# Altium footprint library IC.PcbLib: 386 footprints (part 21 of 30)
Each footprint in its own frame and in the unit in brackets; x right, y up, seen from the top. Pads: shape width x height; smd on the part's side, far side on the other; paste and mask are expansions set on the pad; w line width, h text height; cw(c..) or ccw(c..) is an arc to the next point about the centre after c.
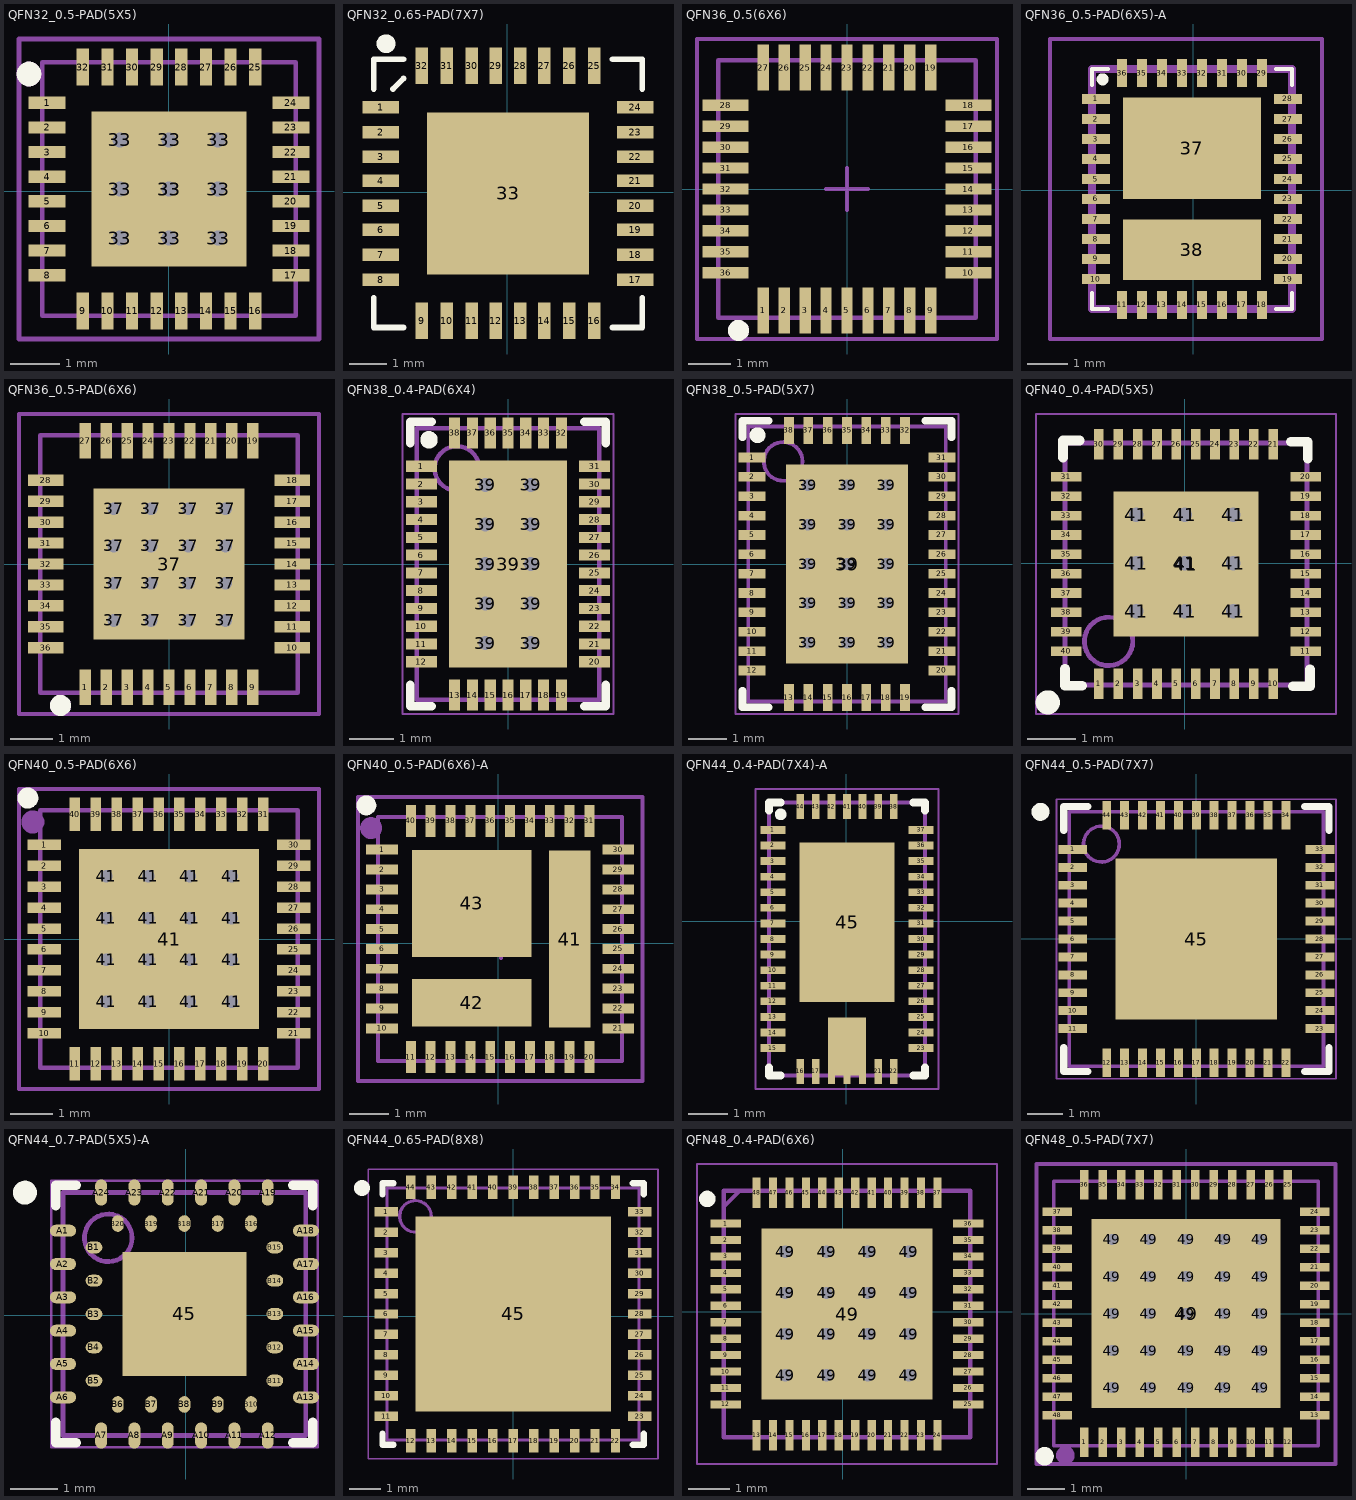
[diagram p20: the footprints below, top view; thin cyan lines are the x and y axes]

## QFN32_0.5-PAD(5X5) [mm] "QFN, 32-Leads, Body 5.2x5.2mm (max), Pitch 0.50mm, IPC Medium Density"
height 1
pads (42):
  rect 0.75x0.25 smd: 1(-2.475,1.801) 2(-2.475,1.301) 3(-2.475,0.801) 4(-2.475,0.301) 5(-2.475,-0.199) 6(-2.475,-0.699) 7(-2.475,-1.199) 8(-2.475,-1.699) 17(2.475,-1.699) 18(2.475,-1.199) 19(2.475,-0.699) 20(2.475,-0.199) 21(2.475,0.301) 22(2.475,0.801) 23(2.475,1.301) 24(2.475,1.801)
  rect 0.25x0.75 smd: 9(-1.75,-2.424) 10(-1.25,-2.424) 11(-0.75,-2.424) 12(-0.25,-2.424) 13(0.25,-2.424) 14(0.75,-2.424) 15(1.25,-2.424) 16(1.75,-2.424) 25(1.75,2.526) 26(1.25,2.526) 27(0.75,2.526) 28(0.25,2.526) 29(-0.25,2.526) 30(-0.75,2.526) 31(-1.25,2.526) 32(-1.75,2.526)
  round 0.61 hole 0.305: 33(-1,-0.949) 33(-1,0.051) 33(-1,1.051) 33(0,-0.949) 33(0,0.051) 33(0,1.051) 33(1,-0.949) 33(1,0.051) 33(1,1.051)
  rect 3.15x3.15 smd paste-3: 33(0,0.051)
Top Overlay:
  circle w0.25: c-2.845,2.388 r0.125
Top Paste:
  rectangle: 0.15,0.201 1.45,1.501
  region: -0.15,0.201 -0.15,1.501 -1.45,1.501 -1.45,0.201
  region: -0.15,-0.099 -1.45,-0.099 -1.45,-1.399 -0.15,-1.399
  region: 0.15,-0.099 0.15,-1.399 1.45,-1.399 1.45,-0.099
Mechanical 15:
  circle w0.25: c-2.845,2.388 r0.125
  lines w0.1: -0.5,0.051 0.5,0.051 ; 0,-0.449 0,0.551 ; -3.048,-2.997 3.048,-2.997 3.048,3.099 -3.048,3.099 -3.048,-2.997 ; -2.575,-2.524 2.575,-2.524 2.575,2.626 -2.575,2.626 -2.575,-2.524
3D body "QFN32-6X6.STEP": height 0.92, standoff -0.01, extent -2.5,-2.449 2.501,2.551

## QFN32_0.65-PAD(7X7) [mil]
height 39.37
pads (33):
  rect 38x13 smd: 1(-132,89) 2(-132,63) 3(-132,37) 4(-132,12) 5(-132,-14) 6(-132,-39) 7(-132,-65) 8(-132,-91) 17(134,-91) 18(134,-65) 19(134,-39) 20(134,-14) 21(134,12) 22(134,37) 23(134,63) 24(134,89)
  rect 13x38 smd: 9(-89,-134) 10(-63,-134) 11(-37,-134) 12(-12,-134) 13(14,-134) 14(39,-134) 15(65,-134) 16(91,-134) 25(91,132) 26(65,132) 27(39,132) 28(14,132) 29(-12,132) 30(-37,132) 31(-63,132) 32(-89,132)
  rect 169x169 smd: 33(1,-1)
Top Overlay:
  circle w9.84: c-126.4,155.2 r4.92
  lines w6: -139,-110 -139,-141 -108,-141 ; -139,108 -139,139 -108,139 ; -119,108 -108,119 ; 110,-141 141,-141 141,-110 ; 110,139 141,139 141,108
3D body "User Library-QFN-32.STEP": height 40.26, standoff -3.69, extent -136.59,-138.8 139,136.8

## QFN36_0.5(6X6) [mm]
pads (36):
  rect 0.27x1.1 smd mask+0.08: 1(-2,-2.9) 2(-1.5,-2.9) 3(-1,-2.9) 4(-0.5,-2.9) 5(0,-2.9) 6(0.5,-2.9) 7(1,-2.9) 8(1.5,-2.9) 9(2,-2.9) 19(2,2.9) 20(1.5,2.9) 21(1,2.9) 22(0.5,2.9) 23(0,2.9) 24(-0.5,2.9) 25(-1,2.9) 26(-1.5,2.9) 27(-2,2.9)
  rect 1.1x0.27 smd mask+0.08: 10(2.9,-2) 11(2.9,-1.5) 12(2.9,-1) 13(2.9,-0.5) 14(2.9,0) 15(2.9,0.5) 16(2.9,1) 17(2.9,1.5) 18(2.9,2) 28(-2.9,2) 29(-2.9,1.5) 30(-2.9,1) 31(-2.9,0.5) 32(-2.9,0) 33(-2.9,-0.5) 34(-2.9,-1) 35(-2.9,-1.5) 36(-2.9,-2)
Top Overlay:
  circle w0.25: c-2.591,-3.378 r0.125
Mechanical 15:
  circle w0.25: c-2.591,-3.378 r0.125
  lines w0.1: -0.5,0 0.5,0 ; 0,-0.5 0,0.5 ; -3.581,-3.581 3.581,-3.581 3.581,3.581 -3.581,3.581 -3.581,-3.581 ; -3.075,-3.075 3.075,-3.075 3.075,3.075 -3.075,3.075 -3.075,-3.075
3D body "QFN36-6X6.STEP": height 0.8, standoff 0, extent -3.06,-3.06 3.06,3.06

## QFN36_0.5-PAD(6X5)-A [mm]
pads (38):
  rect 0.7x0.25 smd: 1(-2.425,2.275) 2(-2.425,1.775) 3(-2.425,1.275) 4(-2.425,0.775) 5(-2.425,0.275) 6(-2.425,-0.225) 7(-2.425,-0.725) 8(-2.425,-1.225) 9(-2.425,-1.725) 10(-2.425,-2.225) 19(2.375,-2.225) 20(2.375,-1.725) 21(2.375,-1.225) 22(2.375,-0.725) 23(2.375,-0.225) 24(2.375,0.275) 25(2.375,0.775) 26(2.375,1.275) 27(2.375,1.775) 28(2.375,2.275)
  rect 0.25x0.7 smd: 11(-1.775,-2.875) 12(-1.275,-2.875) 13(-0.775,-2.875) 14(-0.275,-2.875) 15(0.225,-2.875) 16(0.725,-2.875) 17(1.225,-2.875) 18(1.725,-2.875) 29(1.725,2.925) 30(1.225,2.925) 31(0.725,2.925) 32(0.225,2.925) 33(-0.275,2.925) 34(-0.775,2.925) 35(-1.275,2.925) 36(-1.775,2.925)
  rect 3.45x2.54 smd: 37(-0.025,1.045)
  rect 3.45x1.52 smd: 38(-0.025,-1.495)
Top Overlay:
  circle w0.25: c-2.261,2.769 r0.025
  lines w0.1: -2.525,-2.575 -2.525,-2.975 -2.125,-2.975 ; -2.525,2.625 -2.525,2.725 -2.525,3.025 -2.125,3.025 ; 2.075,-2.975 2.475,-2.975 2.475,-2.575 ; 2.075,3.025 2.475,3.025 2.475,2.625
Mechanical 13:
  lines w0.2: -2.525,-2.975 -2.525,3.025 2.475,3.025 2.475,-2.975 -2.525,-2.975
Mechanical 15:
  lines w0.1: -3.575,-3.725 -3.575,3.775 3.225,3.775 3.225,-3.725 -3.575,-3.725
3D body "LT3651EUHE-8.4#PBF.stp": height 0.9, standoff 0, extent -2.525,-2.975 2.475,3.025

## QFN36_0.5-PAD(6X6) [mm]
pads (53):
  rect 0.27x0.85 smd mask+0.08: 1(-2,-2.938) 2(-1.5,-2.938) 3(-1,-2.938) 4(-0.5,-2.938) 5(0,-2.938) 6(0.5,-2.938) 7(1,-2.938) 8(1.5,-2.938) 9(2,-2.938) 19(2,2.938) 20(1.5,2.938) 21(1,2.938) 22(0.5,2.938) 23(0,2.938) 24(-0.5,2.938) 25(-1,2.938) 26(-1.5,2.938) 27(-2,2.938)
  rect 0.85x0.27 smd mask+0.08: 10(2.938,-2) 11(2.938,-1.5) 12(2.938,-1) 13(2.938,-0.5) 14(2.938,0) 15(2.938,0.5) 16(2.938,1) 17(2.938,1.5) 18(2.938,2) 28(-2.938,2) 29(-2.938,1.5) 30(-2.938,1) 31(-2.938,0.5) 32(-2.938,0) 33(-2.938,-0.5) 34(-2.938,-1) 35(-2.938,-1.5) 36(-2.938,-2)
  round 0.61 hole 0.305: 37(-1.321,-1.346) 37(-1.321,-0.457) 37(-1.321,0.432) 37(-1.321,1.321) 37(-0.432,-1.346) 37(-0.432,-0.457) 37(-0.432,0.432) 37(-0.432,1.321) 37(0.457,-1.346) 37(0.457,-0.457) 37(0.457,0.432) 37(0.457,1.321) 37(1.346,-1.346) 37(1.346,-0.457) 37(1.346,0.432) 37(1.346,1.321)
  rect 3.6x3.6 smd paste-5: 37(0,0)
Top Overlay:
  circle w0.25: c-2.591,-3.378 r0.125
Top Paste:
  rectangle: 0.15,0.15 1.65,1.65
  region: 0.15,-0.15 0.15,-1.65 1.65,-1.65 1.65,-0.15
  region: -0.15,-0.15 -1.65,-0.15 -1.65,-1.65 -0.15,-1.65
  region: -0.15,0.15 -0.15,1.65 -1.65,1.65 -1.65,0.15
Mechanical 15:
  circle w0.25: c-2.591,-3.378 r0.125
  lines w0.1: -0.5,0 0.5,0 ; 0,-0.5 0,0.5 ; -3.581,-3.581 -3.581,3.581 3.581,3.581 3.581,-3.581 -3.581,-3.581 ; -3.075,-3.075 -3.075,3.075 3.075,3.075 3.075,-3.075 -3.075,-3.075
3D body "QFN36-6X6.STEP": height 0.8, standoff 0, extent -3.06,-3.06 3.06,3.06

## QFN38_0.4-PAD(6X4) [mm] "QFN, 32-Leads, Body 5.2x5.2mm (max), Pitch 0.50mm, IPC Medium Density"
height 1
pads (49):
  rect 0.7x0.25 smd: 1(-1.95,2.2) 2(-1.95,1.8) 3(-1.95,1.4) 4(-1.95,1) 5(-1.95,0.6) 6(-1.95,0.2) 7(-1.95,-0.2) 8(-1.95,-0.6) 9(-1.95,-1) 10(-1.95,-1.4) 11(-1.95,-1.8) 12(-1.95,-2.2) 20(1.95,-2.2) 21(1.95,-1.8) 22(1.95,-1.4) 23(1.95,-1) 24(1.95,-0.6) 25(1.95,-0.2) 26(1.95,0.2) 27(1.95,0.6) 28(1.95,1) 29(1.95,1.4) 30(1.95,1.8) 31(1.95,2.2)
  rect 0.25x0.7 smd: 13(-1.2,-2.95) 14(-0.8,-2.95) 15(-0.4,-2.95) 16(0,-2.95) 17(0.4,-2.95) 18(0.8,-2.95) 19(1.2,-2.95) 32(1.2,2.95) 33(0.8,2.95) 34(0.4,2.95) 35(0,2.95) 36(-0.4,2.95) 37(-0.8,2.95) 38(-1.2,2.95)
  round 0.61 hole 0.305: 39(-0.508,-1.778) 39(-0.508,-0.889) 39(-0.508,0) 39(-0.508,0.889) 39(-0.508,1.778) 39(0.508,-1.778) 39(0.508,-0.889) 39(0.508,0) 39(0.508,0.889) 39(0.508,1.778)
  rect 2.65x4.65 smd: 39(0,0)
Top Overlay:
  circle w0.25: c-1.778,2.794 r0.071
  lines w0.2: -2.2,-2.724 -2.2,-3.2 -1.724,-3.2 ; -2.2,2.724 -2.2,3.2 -1.724,3.2 ; 1.724,-3.2 2.2,-3.2 2.2,-2.724 ; 1.724,3.2 2.2,3.2 2.2,2.724
Mechanical 13:
  circle w0.1: c-1.15,2.15 r0.5
  lines w0.1: -2.05,-3.05 -2.05,3.05 2.05,3.05 2.05,-3.05 -2.05,-3.05
Mechanical 15:
  lines w0.05: -2.375,-3.375 -2.375,3.375 2.375,3.375 2.375,-3.375 -2.375,-3.375
  lines w0.1: -0.5,0 0.5,0 ; 0,-0.5 0,0.5
3D body "User Library-QFN-38-1.step": height 0.76, standoff -0.05, extent -2.01,-3.01 2.01,3.01

## QFN38_0.5-PAD(5X7) [mm] "QFN, 32-Leads, Body 5.2x5.2mm (max), Pitch 0.50mm, IPC Medium Density"
height 1
pads (54):
  rect 0.7x0.25 smd: 1(-2.45,2.75) 2(-2.45,2.25) 3(-2.45,1.75) 4(-2.45,1.25) 5(-2.45,0.75) 6(-2.45,0.25) 7(-2.45,-0.25) 8(-2.45,-0.75) 9(-2.45,-1.25) 10(-2.45,-1.75) 11(-2.45,-2.25) 12(-2.45,-2.75) 20(2.45,-2.75) 21(2.45,-2.25) 22(2.45,-1.75) 23(2.45,-1.25) 24(2.45,-0.75) 25(2.45,-0.25) 26(2.45,0.25) 27(2.45,0.75) 28(2.45,1.25) 29(2.45,1.75) 30(2.45,2.25) 31(2.45,2.75)
  rect 0.25x0.7 smd: 13(-1.5,-3.45) 14(-1,-3.45) 15(-0.5,-3.45) 16(0,-3.45) 17(0.5,-3.45) 18(1,-3.45) 19(1.5,-3.45) 32(1.5,3.45) 33(1,3.45) 34(0.5,3.45) 35(0,3.45) 36(-0.5,3.45) 37(-1,3.45) 38(-1.5,3.45)
  round 0.61 hole 0.305: 39(-1.016,-2.032) 39(-1.016,-1.016) 39(-1.016,0) 39(-1.016,1.016) 39(-1.016,2.032) 39(0,-2.032) 39(0,-1.016) 39(0,0) 39(0,1.016) 39(0,2.032) 39(1.016,-2.032) 39(1.016,-1.016) 39(1.016,0) 39(1.016,1.016) 39(1.016,2.032)
  rect 3.15x5.15 smd: 39(0,0)
Top Overlay:
  circle w0.25: c-2.311,3.327 r0.079
  lines w0.2: -2.7,-3.275 -2.7,-3.7 -2.025,-3.7 ; -2.7,3.275 -2.7,3.7 -2.025,3.7 ; 2.025,-3.7 2.7,-3.7 2.7,-3.275 ; 2.025,3.7 2.7,3.7 2.7,3.275
Mechanical 13:
  circle w0.1: c-1.65,2.65 r0.5
  lines w0.1: -2.55,-3.55 -2.55,3.55 2.55,3.55 2.55,-3.55 -2.55,-3.55
Mechanical 15:
  lines w0.05: -2.875,-3.875 -2.875,3.875 2.875,3.875 2.875,-3.875 -2.875,-3.875
  lines w0.1: -0.5,0 0.5,0 ; 0,-0.5 0,0.5
3D body "User Library-QFN-38.STEP": height 1.04, standoff -0.09, extent -2.511,-3.517 2.509,3.503

## QFN40_0.4-PAD(5X5) [mm]
pads (50):
  rect 0.2x0.635 smd: 1(-1.773,-2.494) 2(-1.373,-2.494) 3(-0.973,-2.494) 4(-0.573,-2.494) 5(-0.173,-2.494) 6(0.227,-2.494) 7(0.627,-2.494) 8(1.027,-2.494) 9(1.427,-2.494) 10(1.827,-2.494) 21(1.827,2.454) 22(1.427,2.454) 23(1.027,2.454) 24(0.627,2.454) 25(0.227,2.454) 26(-0.173,2.454) 27(-0.573,2.454) 28(-0.973,2.454) 29(-1.373,2.454) 30(-1.773,2.454)
  rect 0.635x0.2 smd: 11(2.501,-1.82) 12(2.501,-1.42) 13(2.501,-1.02) 14(2.501,-0.62) 15(2.501,-0.22) 16(2.501,0.18) 17(2.501,0.58) 18(2.501,0.98) 19(2.501,1.38) 20(2.501,1.78) 31(-2.448,1.78) 32(-2.448,1.38) 33(-2.448,0.98) 34(-2.448,0.58) 35(-2.448,0.18) 36(-2.448,-0.22) 37(-2.448,-0.62) 38(-2.448,-1.02) 39(-2.448,-1.42) 40(-2.448,-1.82)
  round 0.6 hole 0.3: 41(-0.997,-1) 41(-0.997,0) 41(-0.997,1) 41(0.003,-1) 41(0.003,0) 41(0.003,1) 41(1.003,-1) 41(1.003,0) 41(1.003,1)
  rect 3x3 smd: 41(0.027,-0.02)
Top Overlay:
  circle w0.25: c-2.83,-2.88 r0.125
  lines w0.2: -2.517,2.181 -2.517,2.531 -2.167,2.531 ; -2.474,-2.188 -2.474,-2.538 -2.124,-2.538 ; 2.195,2.508 2.545,2.508 2.545,2.158 ; 2.238,-2.548 2.588,-2.548 2.588,-2.198
Mechanical 13:
  circle w0.1: c-1.573,-1.62 r0.5
  lines w0.1: -2.473,-2.52 -2.473,2.48 2.527,2.48 2.527,-2.52 -2.473,-2.52
Mechanical 15:
  lines w0.05: -3.073,-3.12 -3.073,3.08 3.127,3.08 3.127,-3.12 -3.073,-3.12
  lines w0.1: -0.473,-0.02 0.527,-0.02 ; 0.027,-0.52 0.027,0.48
3D body "TPS65023RSBR.stp": height 0.8, standoff 0, extent -2.523,-2.57 2.577,2.53

## QFN40_0.5-PAD(6X6) [mm] "QFN, 40-Leads, Body 6.2x6.2mm (max), Pitch 0.50mm, IPC Low Density"
height 1
pads (57):
  rect 0.8x0.25 smd: 1(-2.975,2.25) 2(-2.975,1.75) 3(-2.975,1.25) 4(-2.975,0.75) 5(-2.975,0.25) 6(-2.975,-0.25) 7(-2.975,-0.75) 8(-2.975,-1.25) 9(-2.975,-1.75) 10(-2.975,-2.25) 21(2.975,-2.25) 22(2.975,-1.75) 23(2.975,-1.25) 24(2.975,-0.75) 25(2.975,-0.25) 26(2.975,0.25) 27(2.975,0.75) 28(2.975,1.25) 29(2.975,1.75) 30(2.975,2.25)
  rect 0.25x0.8 smd: 11(-2.25,-2.975) 12(-1.75,-2.975) 13(-1.25,-2.975) 14(-0.75,-2.975) 15(-0.25,-2.975) 16(0.25,-2.975) 17(0.75,-2.975) 18(1.25,-2.975) 19(1.75,-2.975) 20(2.25,-2.975) 31(2.25,2.975) 32(1.75,2.975) 33(1.25,2.975) 34(0.75,2.975) 35(0.25,2.975) 36(-0.25,2.975) 37(-0.75,2.975) 38(-1.25,2.975) 39(-1.75,2.975) 40(-2.25,2.975)
  round 0.6 hole 0.3: 41(-1.5,-1.5) 41(-1.5,-0.5) 41(-1.5,0.5) 41(-1.5,1.5) 41(-0.5,-1.5) 41(-0.5,-0.5) 41(-0.5,0.5) 41(-0.5,1.5) 41(0.5,-1.5) 41(0.5,-0.5) 41(0.5,0.5) 41(0.5,1.5) 41(1.5,-1.5) 41(1.5,-0.5) 41(1.5,0.5) 41(1.5,1.5)
  rect 4.3x4.3 smd paste-6: 41(0,0)
Top Overlay:
  circle w0.25: c-3.371,3.365 r0.125
Top Paste:
  rectangle: -0.6,0.9 0.6,2.1
  rectangle: -0.6,-0.6 0.6,0.6
  region: -2.1,2.1 -2.1,0.9 -0.9,0.9 -0.9,2.1
  region: -2.1,0.6 -2.1,-0.6 -0.9,-0.6 -0.9,0.6
  region: 2.1,-0.6 2.1,0.6 0.9,0.6 0.9,-0.6
  region: 2.1,0.9 2.1,2.1 0.9,2.1 0.9,0.9
  rectangle: -2.1,-2.1 -0.9,-0.9
  rectangle: -0.6,-2.1 0.6,-0.9
  rectangle: 0.9,-2.1 2.1,-0.9
Mechanical 15:
  circle w0.3: c-3.251,2.794 r0.125
  lines w0.1: -0.5,0 0.5,0 ; 0,-0.5 0,0.5 ; -3.581,-3.581 3.581,-3.581 3.581,3.581 -3.581,3.581 -3.581,-3.581 ; -3.075,-3.075 3.075,-3.075 3.075,3.075 -3.075,3.075 -3.075,-3.075
3D body "User Library-QFN40-1.step": height 0.9, standoff 0, extent -3,-3 3,3

## QFN40_0.5-PAD(6X6)-A [mm]
height 1
pads (43):
  rect 0.8x0.25 smd: 1(-2.924,2.352) 2(-2.924,1.852) 3(-2.924,1.352) 4(-2.924,0.852) 5(-2.924,0.352) 6(-2.924,-0.148) 7(-2.924,-0.648) 8(-2.924,-1.148) 9(-2.924,-1.648) 10(-2.924,-2.148) 21(3.026,-2.148) 22(3.026,-1.648) 23(3.026,-1.148) 24(3.026,-0.648) 25(3.026,-0.148) 26(3.026,0.352) 27(3.026,0.852) 28(3.026,1.352) 29(3.026,1.852) 30(3.026,2.352)
  rect 0.25x0.8 smd: 11(-2.199,-2.873) 12(-1.699,-2.873) 13(-1.199,-2.873) 14(-0.699,-2.873) 15(-0.199,-2.873) 16(0.301,-2.873) 17(0.801,-2.873) 18(1.301,-2.873) 19(1.801,-2.873) 20(2.301,-2.873) 31(2.301,3.077) 32(1.801,3.077) 33(1.301,3.077) 34(0.801,3.077) 35(0.301,3.077) 36(-0.199,3.077) 37(-0.699,3.077) 38(-1.199,3.077) 39(-1.699,3.077) 40(-2.199,3.077)
  rect 1.05x4.45 smd: 41(1.803,0.102)
  rect 3x1.2 smd: 42(-0.664,-1.502)
  rect 3x2.7 smd: 43(-0.664,0.998)
Top Overlay:
  circle w0.25: c-3.32,3.467 r0.125
Mechanical 15:
  circle w0.3: c-3.2,2.896 r0.125
  lines w0.1: -0.429,0.123 0.571,0.123 ; 0.071,-0.377 0.071,0.623 ; -3.531,-3.48 3.632,-3.48 3.632,3.683 -3.531,3.683 -3.531,-3.48 ; -3.024,-2.973 3.126,-2.973 3.126,3.177 -3.024,3.177 -3.024,-2.973
3D body "User Library-QFN40-1.step": height 0.9, standoff 0, extent -3,-3 3,3

## QFN44_0.4-PAD(7X4)-A [mm]
height 1
pads (46):
  rect 0.65x0.2 smd: 1(-1.875,2.345) 2(-1.875,1.945) 3(-1.875,1.545) 4(-1.875,1.145) 5(-1.875,0.745) 6(-1.875,0.345) 7(-1.875,-0.055) 8(-1.875,-0.455) 9(-1.875,-0.855) 10(-1.875,-1.255) 11(-1.875,-1.655) 12(-1.875,-2.055) 13(-1.875,-2.455) 14(-1.875,-2.855) 15(-1.875,-3.255) 23(1.925,-3.255) 24(1.925,-2.855) 25(1.925,-2.455) 26(1.925,-2.055) 27(1.925,-1.655) 28(1.925,-1.255) 29(1.925,-0.855) 30(1.925,-0.455) 31(1.925,-0.055) 32(1.925,0.345) 33(1.925,0.745) 34(1.925,1.145) 35(1.925,1.545) 36(1.925,1.945) 37(1.925,2.345)
  rect 0.2x0.65 smd: 16(-1.175,-3.855) 17(-0.775,-3.855) 21(0.825,-3.855) 22(1.225,-3.855) 38(1.225,2.945) 39(0.825,2.945) 40(0.425,2.945) 41(0.025,2.945) 42(-0.375,2.945) 43(-0.775,2.945) 44(-1.175,2.945)
  rect 0.18x0.65 smd: 18(-0.375,-3.855) 19(0.025,-3.855) 20(0.425,-3.855)
  rect 2.45x4.1 smd: 45(0.025,-0.025)
  rect 0.98x1.48 smd: ""(0.025,-3.215)
Top Overlay:
  circle w0.25: c-1.676,2.743 r0.025
  lines w0.2: -1.975,-3.755 -1.975,-3.955 -1.675,-3.955 ; -1.975,2.845 -1.975,3.045 -1.675,3.045 ; 1.725,-3.955 2.025,-3.955 2.025,-3.755 ; 1.725,3.045 2.025,3.045 2.025,2.845
Mechanical 13:
  lines w0.1: -1.975,-3.955 -1.975,3.045 2.025,3.045 2.025,-3.955 -1.975,-3.955
Mechanical 15:
  lines w0.05: -2.325,-4.305 2.375,-4.305 2.375,3.395 -2.325,3.395 -2.325,-4.305
  lines w0.1: -0.475,-0.455 0.525,-0.455 ; 0.025,-0.955 0.025,0.045
3D body: height 0.8, standoff 0, extent -1.975,-3.955 2.025,3.045
3D body: height 0.81, standoff 0.4, extent -1.727,2.29 -1.229,2.789

## QFN44_0.5-PAD(7X7) [mm]
height 1
pads (45):
  rect 0.8x0.25 smd: 1(-3.45,2.491) 2(-3.45,1.991) 3(-3.45,1.491) 4(-3.45,0.991) 5(-3.45,0.491) 6(-3.45,-0.009) 7(-3.45,-0.509) 8(-3.45,-1.009) 9(-3.45,-1.509) 10(-3.45,-2.009) 11(-3.45,-2.509) 23(3.454,-2.509) 24(3.454,-2.009) 25(3.454,-1.509) 26(3.454,-1.009) 27(3.454,-0.509) 28(3.454,-0.009) 29(3.454,0.491) 30(3.454,0.991) 31(3.454,1.491) 32(3.454,1.991) 33(3.454,2.491)
  rect 0.25x0.8 smd: 12(-2.498,-3.461) 13(-1.998,-3.461) 14(-1.498,-3.461) 15(-0.998,-3.461) 16(-0.498,-3.461) 17(0.002,-3.461) 18(0.502,-3.461) 19(1.002,-3.461) 20(1.502,-3.461) 21(2.002,-3.461) 22(2.502,-3.461) 34(2.502,3.443) 35(2.002,3.443) 36(1.502,3.443) 37(1.002,3.443) 38(0.502,3.443) 39(0.002,3.443) 40(-0.498,3.443) 41(-0.998,3.443) 42(-1.498,3.443) 43(-1.998,3.443) 44(-2.498,3.443)
  rect 4.5x4.5 smd: 45(0.002,-0.009)
Top Overlay:
  circle w0.25: c-4.348,3.541 r0.125
  lines w0.2: -3.698,-3.034 -3.698,-3.709 -3.023,-3.709 ; -3.698,3.016 -3.698,3.691 -3.023,3.691 ; 3.027,-3.709 3.702,-3.709 3.702,-3.034 ; 3.027,3.691 3.702,3.691 3.702,3.016
Mechanical 13:
  circle w0.1: c-2.648,2.641 r0.5
  lines w0.1: -3.548,-3.559 3.552,-3.559 3.552,3.541 -3.548,3.541 -3.548,-3.559
Mechanical 15:
  lines w0.05: -3.898,-3.909 3.902,-3.909 3.902,3.891 -3.898,3.891 -3.898,-3.909
  lines w0.1: -0.498,-0.009 0.502,-0.009 ; 0.002,-0.509 0.002,0.491
3D body "User Library-QFN 44.step": height 0.85, standoff 0, extent -3.497,-3.505 3.505,3.497

## QFN44_0.7-PAD(5X5)-A [mm]
height 1
pads (45):
  rect 2.6x2.6 smd: 45(-0.025,0.025)
  oval 0.55x0.25 smd: A1(-2.577,1.775) A2(-2.577,1.075) A3(-2.577,0.375) A4(-2.577,-0.325) A5(-2.577,-1.025) A6(-2.577,-1.725) A13(2.527,-1.725) A14(2.527,-1.025) A15(2.527,-0.325) A16(2.527,0.375) A17(2.527,1.075) A18(2.527,1.775)
  oval 0.25x0.55 smd: A7(-1.775,-2.527) A8(-1.075,-2.527) A9(-0.375,-2.527) A10(0.325,-2.527) A11(1.025,-2.527) A12(1.725,-2.527) A19(1.725,2.577) A20(1.025,2.577) A21(0.325,2.577) A22(-0.375,2.577) A23(-1.075,2.577) A24(-1.775,2.577)
  oval 0.35x0.25 smd: B1(-1.925,1.425) B2(-1.925,0.725) B3(-1.925,0.025) B4(-1.925,-0.675) B5(-1.925,-1.375) B11(1.875,-1.375) B12(1.875,-0.675) B13(1.875,0.025) B14(1.875,0.725) B15(1.875,1.425)
  oval 0.25x0.35 smd: B6(-1.425,-1.875) B7(-0.725,-1.875) B8(-0.025,-1.875) B9(0.675,-1.875) B10(1.375,-1.875) B16(1.375,1.925) B17(0.675,1.925) B18(-0.025,1.925) B19(-0.725,1.925) B20(-1.425,1.925)
Top Overlay:
  circle w0.25: c-3.375,2.575 r0.125
  lines w0.2: -2.725,-2.25 -2.725,-2.675 -2.3,-2.675 ; -2.725,2.3 -2.725,2.725 -2.3,2.725 ; 2.25,-2.675 2.675,-2.675 2.675,-2.25 ; 2.25,2.725 2.675,2.725 2.675,2.3
Mechanical 13:
  circle w0.1: c-1.625,1.625 r0.5
  lines w0.1: -2.575,-2.525 -2.575,2.575 2.525,2.575 2.525,-2.525 -2.575,-2.525
Mechanical 15:
  lines w0.05: -2.825,-2.775 -2.825,2.825 2.775,2.825 2.775,-2.775 -2.825,-2.775
  lines w0.1: -0.525,0.025 0.475,0.025 ; -0.025,-0.475 -0.025,0.525
3D body: height 1, standoff 0, extent -2.575,-2.525 2.525,2.575
3D body: height 1.01, standoff 0.4, extent -2.204,1.732 -1.706,2.231

## QFN44_0.65-PAD(8X8) [mm]
height 1
pads (45):
  rect 0.75x0.3 smd: 1(-4.025,3.326) 2(-4.025,2.676) 3(-4.025,2.026) 4(-4.025,1.376) 5(-4.025,0.726) 6(-4.025,0.076) 7(-4.025,-0.574) 8(-4.025,-1.224) 9(-4.025,-1.874) 10(-4.025,-2.524) 11(-4.025,-3.174) 23(4.025,-3.174) 24(4.025,-2.524) 25(4.025,-1.874) 26(4.025,-1.224) 27(4.025,-0.574) 28(4.025,0.076) 29(4.025,0.726) 30(4.025,1.376) 31(4.025,2.026) 32(4.025,2.676) 33(4.025,3.326)
  rect 0.3x0.75 smd: 12(-3.25,-3.949) 13(-2.6,-3.949) 14(-1.95,-3.949) 15(-1.3,-3.949) 16(-0.65,-3.949) 17(0,-3.949) 18(0.65,-3.949) 19(1.3,-3.949) 20(1.95,-3.949) 21(2.6,-3.949) 22(3.25,-3.949) 34(3.25,4.102) 35(2.6,4.102) 36(1.95,4.102) 37(1.3,4.102) 38(0.65,4.102) 39(0,4.102) 40(-0.65,4.102) 41(-1.3,4.102) 42(-1.95,4.102) 43(-2.6,4.102) 44(-3.25,4.102)
  rect 6.2x6.2 smd: 45(0,0.076)
Top Overlay:
  circle w0.25: c-4.8,4.076 r0.125
  lines w0.2: -4.15,-3.724 -4.15,-4.074 -3.8,-4.074 ; -4.15,3.876 -4.15,4.226 -3.8,4.226 ; 3.8,-4.074 4.15,-4.074 4.15,-3.724 ; 3.8,4.226 4.15,4.226 4.15,3.876
Mechanical 13:
  circle w0.1: c-3.1,3.176 r0.5
  lines w0.1: -4,-3.924 -4,4.076 4,4.076 4,-3.924 -4,-3.924
Mechanical 15:
  lines w0.05: -4.6,-4.524 -4.6,4.676 4.6,4.676 4.6,-4.524 -4.6,-4.524
  lines w0.1: -0.5,0.076 0.5,0.076 ; 0,-0.424 0,0.576
3D body "User Library-QFN44_8x8.step": height 0.88, standoff -0.02, extent -4.01,-3.934 4.01,4.086

## QFN48_0.4-PAD(6X6) [mm] "QFN, 48-Leads, Body 7.2x7.2mm (max), Pitch 0.50mm, IPC Medium Density"
height 1
pads (65):
  rect 0.75x0.2 smd: 1(-2.848,2.149) 2(-2.848,1.749) 3(-2.848,1.349) 4(-2.848,0.949) 5(-2.848,0.549) 6(-2.848,0.149) 7(-2.848,-0.251) 8(-2.848,-0.651) 9(-2.848,-1.051) 10(-2.848,-1.451) 11(-2.848,-1.851) 12(-2.848,-2.251) 25(3.052,-2.251) 26(3.052,-1.851) 27(3.052,-1.451) 28(3.052,-1.051) 29(3.052,-0.651) 30(3.052,-0.251) 31(3.052,0.149) 32(3.052,0.549) 33(3.052,0.949) 34(3.052,1.349) 35(3.052,1.749) 36(3.052,2.149)
  rect 0.2x0.75 smd: 13(-2.098,-3.001) 14(-1.698,-3.001) 15(-1.298,-3.001) 16(-0.898,-3.001) 17(-0.498,-3.001) 18(-0.098,-3.001) 19(0.302,-3.001) 20(0.702,-3.001) 21(1.102,-3.001) 22(1.502,-3.001) 23(1.902,-3.001) 24(2.302,-3.001) 37(2.302,2.899) 38(1.902,2.899) 39(1.502,2.899) 40(1.102,2.899) 41(0.702,2.899) 42(0.302,2.899) 43(-0.098,2.899) 44(-0.498,2.899) 45(-0.898,2.899) 46(-1.298,2.899) 47(-1.698,2.899) 48(-2.098,2.899)
  round 0.6 hole 0.3: 49(-1.397,-1.54) 49(-1.397,-0.54) 49(-1.397,0.46) 49(-1.397,1.46) 49(-0.397,-1.54) 49(-0.397,-0.54) 49(-0.397,0.46) 49(-0.397,1.46) 49(0.603,-1.54) 49(0.603,-0.54) 49(0.603,0.46) 49(0.603,1.46) 49(1.603,-1.54) 49(1.603,-0.54) 49(1.603,0.46) 49(1.603,1.46)
  rect 4.15x4.15 smd: 49(0.102,-0.051)
Top Overlay:
  circle w0.2: c-3.298,2.749 r0.1
Mechanical 13:
  lines w0.1: -2.898,2.549 -2.498,2.949 ; -2.898,-3.051 3.102,-3.051 3.102,2.949 -2.898,2.949 -2.898,-3.051
Mechanical 15:
  lines w0.05: -3.548,-3.701 3.752,-3.701 3.752,3.599 -3.548,3.599 -3.548,-3.701
3D body "TPS65217CRSLT.stp": height 1, standoff 0, extent -2.948,-3.101 3.152,2.999

## QFN48_0.5-PAD(7X7) [mm] "QFN, 48-Leads, Body 7.2x7.2mm (max), Pitch 0.50mm, IPC Medium Density"
height 1
pads (74):
  rect 0.23x0.8 smd: 1(-2.75,-3.475) 2(-2.25,-3.475) 3(-1.75,-3.475) 4(-1.25,-3.475) 5(-0.75,-3.475) 6(-0.25,-3.475) 7(0.25,-3.475) 8(0.75,-3.475) 9(1.25,-3.475) 10(1.75,-3.475) 11(2.25,-3.475) 12(2.75,-3.475) 25(2.75,3.475) 26(2.25,3.475) 27(1.75,3.475) 28(1.25,3.475) 29(0.75,3.475) 30(0.25,3.475) 31(-0.25,3.475) 32(-0.75,3.475) 33(-1.25,3.475) 34(-1.75,3.475) 35(-2.25,3.475) 36(-2.75,3.475)
  rect 0.8x0.23 smd: 13(3.475,-2.75) 14(3.475,-2.25) 15(3.475,-1.75) 16(3.475,-1.25) 17(3.475,-0.75) 18(3.475,-0.25) 19(3.475,0.25) 20(3.475,0.75) 21(3.475,1.25) 22(3.475,1.75) 23(3.475,2.25) 24(3.475,2.75) 37(-3.475,2.75) 38(-3.475,2.25) 39(-3.475,1.75) 40(-3.475,1.25) 41(-3.475,0.75) 42(-3.475,0.25) 43(-3.475,-0.25) 44(-3.475,-0.75) 45(-3.475,-1.25) 46(-3.475,-1.75) 47(-3.475,-2.25) 48(-3.475,-2.75)
  round 0.6 hole 0.3: 49(-2,-2) 49(-2,-1) 49(-2,0) 49(-2,1) 49(-2,2) 49(-1,-2) 49(-1,-1) 49(-1,0) 49(-1,1) 49(-1,2) 49(0,-2) 49(0,-1) 49(0,0) 49(0,1) 49(0,2) 49(1,-2) 49(1,-1) 49(1,0) 49(1,1) 49(1,2) 49(2,-2) 49(2,-1) 49(2,0) 49(2,1) 49(2,2)
  rect 5.1x5.1 smd paste-5: 49(0,0)
Top Overlay:
  circle w0.25: c-3.82,-3.856 r0.125
Top Paste:
  region: 2.475,-1.025 1.025,-1.025 1.025,-2.475 2.475,-2.475
  region: 0.725,-1.025 -0.725,-1.025 -0.725,-2.475 0.725,-2.475
  region: -1.025,-1.025 -2.475,-1.025 -2.475,-2.475 -1.025,-2.475
  region: 2.475,2.475 1.025,2.475 1.025,1.025 2.475,1.025
  region: -1.025,2.475 -2.475,2.475 -2.475,1.025 -1.025,1.025
  region: 0.725,2.475 -0.725,2.475 -0.725,1.025 0.725,1.025
  region: 2.475,-0.725 2.475,0.725 1.025,0.725 1.025,-0.725
  region: -1.025,-0.725 -1.025,0.725 -2.475,0.725 -2.475,-0.725
  region: 0.725,-0.725 0.725,0.725 -0.725,0.725 -0.725,-0.725
Mechanical 15:
  circle w0.25: c-3.259,-3.83 r0.125
  lines w0.1: -0.5,0 0.5,0 ; 0,-0.5 0,0.5 ; -4.039,-4.064 4.039,-4.064 4.039,4.039 -4.039,4.039 -4.039,-4.064 ; -3.575,-3.575 3.575,-3.575 3.575,3.575 -3.575,3.575 -3.575,-3.575
3D body "QFN48-7x7.STEP": height 0.79, standoff -0.01, extent -3.51,-3.51 3.51,3.51